# Altium footprint library SAMTEC SMD.PcbLib: 165 footprints (part 15 of 17) (continued)
## SAMTEC_SEAM-30-03.0-L-06-2-A-K-TR [mm] "PISMO 2, VITA 57, VITA 57 Standard, 6 rows x 30 Columns, 180 contacts Male Connector" (continued)
  text "180" at -19.74,-4.969 h1
  text "1" at 18.919,3.935 h1
Mechanical 15:
  lines w0.05: -21.79,-5.05 21.79,-5.05 21.79,-1.012 22.678,-1.012 22.678,1.012 21.79,1.012 21.79,5.05 -21.79,5.05 -21.79,-5.05
3D body "SEAM-30-03.0-L-06-2-A-K-TR.stp": height 6.6, standoff -1.27, extent -21.539,-4.8 22.428,4.801

## SAMTEC_SEAM-40-03.0-S-06-2-A-K-TR [mm] "240 contacts (6 rows x 40 Columns) High Speed/High Density Open Field Board Stacking Male Connector"
height 6.61
pads (242):
  round 0.64 smd paste+0.125: 1(24.761,3.175) 2(24.761,1.905) 3(24.761,0.635) 4(24.761,-0.635) 5(24.761,-1.905) 6(24.761,-3.175) 7(23.491,3.175) 8(23.491,1.905) 9(23.491,0.635) 10(23.491,-0.635) 11(23.491,-1.905) 12(23.491,-3.175) 13(22.221,3.175) 14(22.221,1.905) 15(22.221,0.635) 16(22.221,-0.635) 17(22.221,-1.905) 18(22.221,-3.175) 19(20.951,3.175) 20(20.951,1.905) 21(20.951,0.635) 22(20.951,-0.635) 23(20.951,-1.905) 24(20.951,-3.175) 25(19.681,3.175) 26(19.681,1.905) 27(19.681,0.635) 28(19.681,-0.635) 29(19.681,-1.905) 30(19.681,-3.175) 31(18.411,3.175) 32(18.411,1.905) 33(18.411,0.635) 34(18.411,-0.635) 35(18.411,-1.905) 36(18.411,-3.175) 37(17.141,3.175) 38(17.141,1.905) 39(17.141,0.635) 40(17.141,-0.635) 41(17.141,-1.905) 42(17.141,-3.175) 43(15.871,3.175) 44(15.871,1.905) 45(15.871,0.635) 46(15.871,-0.635) 47(15.871,-1.905) 48(15.871,-3.175) 49(14.601,3.175) 50(14.601,1.905) 51(14.601,0.635) 52(14.601,-0.635) 53(14.601,-1.905) 54(14.601,-3.175) 55(13.331,3.175) 56(13.331,1.905) 57(13.331,0.635) 58(13.331,-0.635) 59(13.331,-1.905) 60(13.331,-3.175) 61(12.061,3.175) 62(12.061,1.905) 63(12.061,0.635) 64(12.061,-0.635) 65(12.061,-1.905) 66(12.061,-3.175) 67(10.791,3.175) 68(10.791,1.905) 69(10.791,0.635) 70(10.791,-0.635) 71(10.791,-1.905) 72(10.791,-3.175) 73(9.521,3.175) 74(9.521,1.905) 75(9.521,0.635) 76(9.521,-0.635) 77(9.521,-1.905) 78(9.521,-3.175) 79(8.251,3.175) 80(8.251,1.905) 81(8.251,0.635) 82(8.251,-0.635) 83(8.251,-1.905) 84(8.251,-3.175) 85(6.981,3.175) 86(6.981,1.905) 87(6.981,0.635) 88(6.981,-0.635) 89(6.981,-1.905) 90(6.981,-3.175) 91(5.711,3.175) 92(5.711,1.905) 93(5.711,0.635) 94(5.711,-0.635) 95(5.711,-1.905) 96(5.711,-3.175) 97(4.441,3.175) 98(4.441,1.905) 99(4.441,0.635) 100(4.441,-0.635) 101(4.441,-1.905) 102(4.441,-3.175) 103(3.171,3.175) 104(3.171,1.905) 105(3.171,0.635) 106(3.171,-0.635) 107(3.171,-1.905) 108(3.171,-3.175) 109(1.901,3.175) 110(1.901,1.905) 111(1.901,0.635) 112(1.901,-0.635) 113(1.901,-1.905) 114(1.901,-3.175) 115(0.631,3.175) 116(0.631,1.905) 117(0.631,0.635) 118(0.631,-0.635) 119(0.631,-1.905) 120(0.631,-3.175) 121(-0.639,3.175) 122(-0.639,1.905) 123(-0.639,0.635) 124(-0.639,-0.635) 125(-0.639,-1.905) 126(-0.639,-3.175) 127(-1.909,3.175) 128(-1.909,1.905) 129(-1.909,0.635) 130(-1.909,-0.635) 131(-1.909,-1.905) 132(-1.909,-3.175) 133(-3.179,3.175) 134(-3.179,1.905) 135(-3.179,0.635) 136(-3.179,-0.635) 137(-3.179,-1.905) 138(-3.179,-3.175) 139(-4.449,3.175) 140(-4.449,1.905) 141(-4.449,0.635) 142(-4.449,-0.635) 143(-4.449,-1.905) 144(-4.449,-3.175) 145(-5.719,3.175) 146(-5.719,1.905) 147(-5.719,0.635) 148(-5.719,-0.635) 149(-5.719,-1.905) 150(-5.719,-3.175) 151(-6.989,3.175) 152(-6.989,1.905) 153(-6.989,0.635) 154(-6.989,-0.635) 155(-6.989,-1.905) 156(-6.989,-3.175) 157(-8.259,3.175) 158(-8.259,1.905) 159(-8.259,0.635) 160(-8.259,-0.635) 161(-8.259,-1.905) 162(-8.259,-3.175) 163(-9.529,3.175) 164(-9.529,1.905) 165(-9.529,0.635) 166(-9.529,-0.635) 167(-9.529,-1.905) 168(-9.529,-3.175) 169(-10.799,3.175) 170(-10.799,1.905) 171(-10.799,0.635) 172(-10.799,-0.635) 173(-10.799,-1.905) 174(-10.799,-3.175) 175(-12.069,3.175) 176(-12.069,1.905) 177(-12.069,0.635) 178(-12.069,-0.635) 179(-12.069,-1.905) 180(-12.069,-3.175) 181(-13.339,3.175) 182(-13.339,1.905) 183(-13.339,0.635) 184(-13.339,-0.635) 185(-13.339,-1.905) 186(-13.339,-3.175) 187(-14.609,3.175) 188(-14.609,1.905) 189(-14.609,0.635) 190(-14.609,-0.635) 191(-14.609,-1.905) 192(-14.609,-3.175) 193(-15.879,3.175) 194(-15.879,1.905) 195(-15.879,0.635) 196(-15.879,-0.635) 197(-15.879,-1.905) 198(-15.879,-3.175) 199(-17.149,3.175) 200(-17.149,1.905) 201(-17.149,0.635) 202(-17.149,-0.635) 203(-17.149,-1.905) 204(-17.149,-3.175) 205(-18.419,3.175) 206(-18.419,1.905) 207(-18.419,0.635) 208(-18.419,-0.635) 209(-18.419,-1.905) 210(-18.419,-3.175) 211(-19.689,3.175) 212(-19.689,1.905) 213(-19.689,0.635) 214(-19.689,-0.635) 215(-19.689,-1.905) 216(-19.689,-3.175) 217(-20.959,3.175) 218(-20.959,1.905) 219(-20.959,0.635) 220(-20.959,-0.635) 221(-20.959,-1.905) 222(-20.959,-3.175) 223(-22.229,3.175) 224(-22.229,1.905) 225(-22.229,0.635) 226(-22.229,-0.635) 227(-22.229,-1.905) 228(-22.229,-3.175) 229(-23.499,3.175) 230(-23.499,1.905) 231(-23.499,0.635) 232(-23.499,-0.635) 233(-23.499,-1.905) 234(-23.499,-3.175) 235(-24.769,3.175) 236(-24.769,1.905) 237(-24.769,0.635) 238(-24.769,-0.635) 239(-24.769,-1.905) 240(-24.769,-3.175)
  round 0.5 hole 1.3 unplated mask+0.4: MEC1(-27.195,-3.05) MEC2(27.185,0)
Top Overlay:
  lines w0.2: -27.893,-3.745 -27.893,-4.039 -27.131,-4.801 -26.805,-4.801 ; -27.893,-2.355 -27.893,4.039 -27.131,4.801 27.123,4.801 27.885,4.039 27.885,0.693 ; -26.953,-0.508 -26.953,0.508 ; -26.953,2.032 -26.953,3.2 ; -26.736,-2.032 -26.953,-1.397 ; -26.736,-0.508 -26.953,-1.143 ; -26.736,0.508 -26.953,1.143 ; -26.736,2.032 -26.953,1.397 ; -26.699,-2.199 -26.699,2.946 ; -26.699,-2.032 -27.893,-2.032 -27.258,-1.397 ; -26.699,-0.508 -27.893,-0.508 -27.258,-1.143 ; -26.699,0.508 -27.893,0.508 -27.258,1.143 ; -26.699,2.032 -27.893,2.032 -27.258,1.397 ; -26.222,-3.2 -25.419,-3.2 ; -26.215,-2.946 -25.419,-2.946 ; -25.419,-2.007 -26.42,-2.007 ; -25.419,-1.88 -26.293,-1.88 ; -25.419,-0.66 -26.293,-0.66 ; -25.419,-0.533 -26.42,-0.533 ; -25.419,0.533 -26.42,0.533 ; -25.419,0.66 -26.293,0.66 ; -25.419,1.88 -26.293,1.88 ; -25.419,2.007 -26.42,2.007 ; -25.419,2.946 -26.699,2.946 ; -25.419,3.2 -26.953,3.2 ; -22.931,-4.8 27.123,-4.8 27.885,-4.039 27.885,-0.693 ; 25.411,-3.2 25.929,-3.2 25.929,-2.946 ; 25.411,-2.946 25.929,-2.946 ; 25.411,-2.007 25.777,-2.007 ; 25.411,-1.88 25.65,-1.88 ; 25.411,-0.66 25.65,-0.66 ; 25.411,-0.533 25.777,-0.533 ; 25.411,0.533 25.777,0.533 ; 25.411,0.66 25.65,0.66 ; 25.411,1.88 25.65,1.88 ; 25.411,2.007 25.777,2.007 ; 25.411,2.946 26.691,2.946 ; 25.411,3.2 26.945,3.2 ; 25.472,3.2 25.421,3.073 26.437,3.073 26.387,3.2 ; 25.929,3.073 25.929,3.2 ; 26.691,-2.438 26.691,-0.852 ; 26.691,-2.007 27.885,-2.007 27.25,-1.383 ; 26.691,0.852 26.691,2.946 ; 26.691,2.007 27.885,2.007 27.25,1.371 ; 26.728,-2.007 26.945,-1.383 ; 26.728,2.007 26.945,1.371 ; 26.945,-2.007 26.945,-2.438 26.437,-2.438 ccw(c26.437,-2.946) 25.929,-2.946 ; 26.945,-0.956 26.945,-1.383 ; 26.945,0.955 26.945,1.371 ; 26.945,2.007 26.945,3.2 ; 27.25,-0.983 27.25,-1.383 ; 27.25,0.983 27.25,1.371 ; 27.879,-0.699 27.885,-0.699 ; 27.879,0.698 27.885,0.698 ; 27.885,-0.762 28.774,-0.762 28.774,0.762 27.885,0.762 ; -27.258,-1.397 -26.953,-1.397 ; -27.258,-1.397 -27.258,-1.143 ; -27.258,-1.143 -26.953,-1.143 ; -27.258,1.143 -26.953,1.143 ; -27.258,1.143 -27.258,1.397 ; -27.258,1.397 -26.953,1.397 ; -26.953,-1.397 -26.953,-1.143 ; -26.953,1.143 -26.953,1.397 ; -26.953,3.2 -26.699,2.946 ; -26.42,-2.007 -26.293,-1.88 ; -26.42,-2.007 -26.42,-0.533 ; -26.42,-0.533 -26.293,-0.66 ; -26.42,0.533 -26.293,0.66 ; -26.42,0.533 -26.42,2.007 ; -26.42,2.007 -26.293,1.88 ; -26.293,-1.88 -26.293,-0.66 ; -26.293,0.66 -26.293,1.88 ; 25.65,-1.88 25.777,-2.007 ; 25.65,-1.88 25.65,-0.66 ; 25.65,-0.66 25.777,-0.533 ; 25.65,0.66 25.65,1.88 ; 25.65,0.66 25.777,0.533 ; 25.65,1.88 25.777,2.007 ; 25.777,-2.007 25.777,-0.533 ; 25.777,0.533 25.777,2.007 ; 26.691,2.946 26.945,3.2 ; 26.945,-1.383 27.25,-1.383 ; 26.945,1.371 27.25,1.371
  text "240" at -26.094,-4.969 h1
  text "1" at 25.265,3.935 h1
Mechanical 8:
  drawing of 979 lines, arcs and shapes, not listed
Mechanical 14:
  lines w0.1: -26.953,-2.032 -26.953,-3.2 ; -26.953,-0.508 -26.953,0.508 ; -26.953,2.032 -26.953,3.2 ; -26.805,-4.801 -27.131,-4.801 -27.893,-4.039 -27.893,4.039 -27.131,4.801 27.123,4.801 27.885,4.039 27.885,-4.039 27.123,-4.801 -22.931,-4.8 ; -26.736,-2.032 -26.953,-1.397 ; -26.736,-0.508 -26.953,-1.143 ; -26.736,0.508 -26.953,1.143 ; -26.736,2.032 -26.953,1.397 ; -26.699,-2.032 -27.893,-2.032 -27.258,-1.397 ; -26.699,-0.508 -27.893,-0.508 -27.258,-1.143 ; -26.699,0.508 -27.893,0.508 -27.258,1.143 ; -26.699,2.032 -27.893,2.032 -27.258,1.397 ; -25.048,-3.2 -25.048,-3.251 -24.489,-3.251 -24.489,-3.2 ; -25.048,-1.88 -25.048,-1.829 -24.489,-1.829 -24.489,-1.88 ; -25.048,-0.66 -25.048,-0.711 -24.489,-0.711 -24.489,-0.66 ; -25.048,0.66 -25.048,0.711 -24.489,0.711 -24.489,0.66 ; -25.048,1.88 -25.048,1.829 -24.489,1.829 -24.489,1.88 ; -25.048,3.2 -25.048,3.251 -24.489,3.251 -24.489,3.2 ; 24.482,-3.2 24.482,-3.251 25.041,-3.251 25.041,-3.2 ; 24.482,-1.88 24.482,-1.829 25.041,-1.829 25.041,-1.88 ; 24.482,-0.66 24.482,-0.711 25.041,-0.711 25.041,-0.66 ; 24.482,0.66 24.482,0.711 25.041,0.711 25.041,0.66 ; 24.482,1.88 24.482,1.829 25.041,1.829 25.041,1.88 ; 24.482,3.2 24.482,3.251 25.041,3.251 25.041,3.2 ; 25.472,3.2 25.421,3.073 26.437,3.073 26.387,3.2 ; 25.929,3.073 25.929,3.2 ; 26.691,-2.438 26.691,-0.699 27.885,-0.699 ; 26.691,-2.007 27.885,-2.007 27.25,-1.383 ; 26.691,2.007 27.885,2.007 27.25,1.371 ; 26.728,-2.007 26.945,-1.383 ; 26.728,2.007 26.945,1.371 ; 26.945,-2.007 26.945,-2.438 26.437,-2.438 ccw(c26.437,-2.946) 25.929,-2.946 ; 26.945,-0.699 26.945,-1.383 ; 26.945,0.698 26.945,1.371 ; 26.945,2.007 26.945,3.2 ; 27.25,-0.699 27.25,-1.383 ; 27.25,0.698 27.25,1.371 ; 27.885,-0.762 28.774,-0.762 28.774,0.762 27.885,0.762 ; 27.885,0.698 26.691,0.698 26.691,2.946 ; -27.258,-1.397 -26.953,-1.397 ; -27.258,-1.397 -27.258,-1.143 ; -27.258,-1.143 -26.953,-1.143 ; -27.258,1.143 -26.953,1.143 ; -27.258,1.143 -27.258,1.397 ; -27.258,1.397 -26.953,1.397 ; -26.953,-3.2 -26.699,-2.946 ; -26.953,-3.2 25.929,-3.2 25.929,-2.946 ; -26.953,-1.397 -26.953,-1.143 ; -26.953,1.143 -26.953,1.397 ; -26.953,3.2 -26.699,2.946 ; -26.953,3.2 26.945,3.2 ; -26.699,-2.946 25.929,-2.946 ; -26.699,-2.946 -26.699,2.946 ; -26.699,2.946 26.691,2.946 ; -26.42,-2.007 -26.293,-1.88 ; -26.42,-2.007 -26.42,-0.533 ; -26.42,-2.007 25.777,-2.007 ; -26.42,-0.533 -26.293,-0.66 ; -26.42,-0.533 25.777,-0.533 ; -26.42,0.533 -26.293,0.66 ; -26.42,0.533 -26.42,2.007 ; -26.42,0.533 25.777,0.533 ; -26.42,2.007 -26.293,1.88 ; -26.42,2.007 25.777,2.007 ; -26.293,-1.88 -26.293,-0.66 ; -26.293,-1.88 25.65,-1.88 ; -26.293,-0.66 25.65,-0.66 ; -26.293,0.66 -26.293,1.88 ; -26.293,0.66 25.65,0.66 ; -26.293,1.88 25.65,1.88 ; 25.65,-1.88 25.777,-2.007 ; 25.65,-1.88 25.65,-0.66 ; 25.65,-0.66 25.777,-0.533 ; 25.65,0.66 25.65,1.88 ; 25.65,0.66 25.777,0.533 ; 25.65,1.88 25.777,2.007 ; 25.777,-2.007 25.777,-0.533 ; 25.777,0.533 25.777,2.007 ; 26.691,2.946 26.945,3.2 ; 26.945,-1.383 27.25,-1.383 ; 26.945,1.371 27.25,1.371
  text "240" at -26.094,-4.969 h1
  text "1" at 25.265,3.935 h1
Mechanical 15:
  lines w0.05: -28.144,-5.05 28.136,-5.05 28.136,-1.012 29.024,-1.012 29.024,1.012 28.136,1.012 28.136,5.05 -28.144,5.05 -28.144,-5.05
3D body "SAMTEC_SEAM-40-03.0-S-06-2-A-K-TR.stp": height 6.6, standoff -1.27, extent -27.89,-4.8 28.778,4.801

## SAMTEC_SEAM-40-03.5-S-08-2-A-K [mm] "320 contacts (8 rows x 40 Columns) High Speed/High Density Open Field Board Stacking Male Connector"
height 7.12
pads (322):
  round 0.64 smd paste+0.125: 1(24.766,4.445) 2(24.766,3.175) 3(24.766,1.905) 4(24.766,0.635) 5(24.766,-0.635) 6(24.766,-1.905) 7(24.766,-3.175) 8(24.766,-4.445) 9(23.496,4.445) 10(23.496,3.175) 11(23.496,1.905) 12(23.496,0.635) 13(23.496,-0.635) 14(23.496,-1.905) 15(23.496,-3.175) 16(23.496,-4.445) 17(22.226,4.445) 18(22.226,3.175) 19(22.226,1.905) 20(22.226,0.635) 21(22.226,-0.635) 22(22.226,-1.905) 23(22.226,-3.175) 24(22.226,-4.445) 25(20.956,4.445) 26(20.956,3.175) 27(20.956,1.905) 28(20.956,0.635) 29(20.956,-0.635) 30(20.956,-1.905) 31(20.956,-3.175) 32(20.956,-4.445) 33(19.686,4.445) 34(19.686,3.175) 35(19.686,1.905) 36(19.686,0.635) 37(19.686,-0.635) 38(19.686,-1.905) 39(19.686,-3.175) 40(19.686,-4.445) 41(18.416,4.445) 42(18.416,3.175) 43(18.416,1.905) 44(18.416,0.635) 45(18.416,-0.635) 46(18.416,-1.905) 47(18.416,-3.175) 48(18.416,-4.445) 49(17.146,4.445) 50(17.146,3.175) 51(17.146,1.905) 52(17.146,0.635) 53(17.146,-0.635) 54(17.146,-1.905) 55(17.146,-3.175) 56(17.146,-4.445) 57(15.876,4.445) 58(15.876,3.175) 59(15.876,1.905) 60(15.876,0.635) 61(15.876,-0.635) 62(15.876,-1.905) 63(15.876,-3.175) 64(15.876,-4.445) 65(14.606,4.445) 66(14.606,3.175) 67(14.606,1.905) 68(14.606,0.635) 69(14.606,-0.635) 70(14.606,-1.905) 71(14.606,-3.175) 72(14.606,-4.445) 73(13.336,4.445) 74(13.336,3.175) 75(13.336,1.905) 76(13.336,0.635) 77(13.336,-0.635) 78(13.336,-1.905) 79(13.336,-3.175) 80(13.336,-4.445) 81(12.066,4.445) 82(12.066,3.175) 83(12.066,1.905) 84(12.066,0.635) 85(12.066,-0.635) 86(12.066,-1.905) 87(12.066,-3.175) 88(12.066,-4.445) 89(10.796,4.445) 90(10.796,3.175) 91(10.796,1.905) 92(10.796,0.635) 93(10.796,-0.635) 94(10.796,-1.905) 95(10.796,-3.175) 96(10.796,-4.445) 97(9.526,4.445) 98(9.526,3.175) 99(9.526,1.905) 100(9.526,0.635) 101(9.526,-0.635) 102(9.526,-1.905) 103(9.526,-3.175) 104(9.526,-4.445) 105(8.256,4.445) 106(8.256,3.175) 107(8.256,1.905) 108(8.256,0.635) 109(8.256,-0.635) 110(8.256,-1.905) 111(8.256,-3.175) 112(8.256,-4.445) 113(6.986,4.445) 114(6.986,3.175) 115(6.986,1.905) 116(6.986,0.635) 117(6.986,-0.635) 118(6.986,-1.905) 119(6.986,-3.175) 120(6.986,-4.445) 121(5.716,4.445) 122(5.716,3.175) 123(5.716,1.905) 124(5.716,0.635) 125(5.716,-0.635) 126(5.716,-1.905) 127(5.716,-3.175) 128(5.716,-4.445) 129(4.446,4.445) 130(4.446,3.175) 131(4.446,1.905) 132(4.446,0.635) 133(4.446,-0.635) 134(4.446,-1.905) 135(4.446,-3.175) 136(4.446,-4.445) 137(3.176,4.445) 138(3.176,3.175) 139(3.176,1.905) 140(3.176,0.635) 141(3.176,-0.635) 142(3.176,-1.905) 143(3.176,-3.175) 144(3.176,-4.445) 145(1.906,4.445) 146(1.906,3.175) 147(1.906,1.905) 148(1.906,0.635) 149(1.906,-0.635) 150(1.906,-1.905) 151(1.906,-3.175) 152(1.906,-4.445) 153(0.636,4.445) 154(0.636,3.175) 155(0.636,1.905) 156(0.636,0.635) 157(0.636,-0.635) 158(0.636,-1.905) 159(0.636,-3.175) 160(0.636,-4.445) 161(-0.634,4.445) 162(-0.634,3.175) 163(-0.634,1.905) 164(-0.634,0.635) 165(-0.634,-0.635) 166(-0.634,-1.905) 167(-0.634,-3.175) 168(-0.634,-4.445) 169(-1.904,4.445) 170(-1.904,3.175) 171(-1.904,1.905) 172(-1.904,0.635) 173(-1.904,-0.635) 174(-1.904,-1.905) 175(-1.904,-3.175) 176(-1.904,-4.445) 177(-3.174,4.445) 178(-3.174,3.175) 179(-3.174,1.905) 180(-3.174,0.635) 181(-3.174,-0.635) 182(-3.174,-1.905) 183(-3.174,-3.175) 184(-3.174,-4.445) 185(-4.444,4.445) 186(-4.444,3.175) 187(-4.444,1.905) 188(-4.444,0.635) 189(-4.444,-0.635) 190(-4.444,-1.905) 191(-4.444,-3.175) 192(-4.444,-4.445) 193(-5.714,4.445) 194(-5.714,3.175) 195(-5.714,1.905) 196(-5.714,0.635) 197(-5.714,-0.635) 198(-5.714,-1.905) 199(-5.714,-3.175) 200(-5.714,-4.445) 201(-6.984,4.445) 202(-6.984,3.175) 203(-6.984,1.905) 204(-6.984,0.635) 205(-6.984,-0.635) 206(-6.984,-1.905) 207(-6.984,-3.175) 208(-6.984,-4.445) 209(-8.254,4.445) 210(-8.254,3.175) 211(-8.254,1.905) 212(-8.254,0.635) 213(-8.254,-0.635) 214(-8.254,-1.905) 215(-8.254,-3.175) 216(-8.254,-4.445) 217(-9.524,4.445) 218(-9.524,3.175) 219(-9.524,1.905) 220(-9.524,0.635) 221(-9.524,-0.635) 222(-9.524,-1.905) 223(-9.524,-3.175) 224(-9.524,-4.445) 225(-10.794,4.445) 226(-10.794,3.175) 227(-10.794,1.905) 228(-10.794,0.635) 229(-10.794,-0.635) 230(-10.794,-1.905) 231(-10.794,-3.175) 232(-10.794,-4.445) 233(-12.064,4.445) 234(-12.064,3.175) 235(-12.064,1.905) 236(-12.064,0.635) 237(-12.064,-0.635) 238(-12.064,-1.905) 239(-12.064,-3.175) 240(-12.064,-4.445) 241(-13.334,4.445) 242(-13.334,3.175) 243(-13.334,1.905) 244(-13.334,0.635) 245(-13.334,-0.635) 246(-13.334,-1.905) 247(-13.334,-3.175) 248(-13.334,-4.445) 249(-14.604,4.445) 250(-14.604,3.175) 251(-14.604,1.905) 252(-14.604,0.635) 253(-14.604,-0.635) 254(-14.604,-1.905) 255(-14.604,-3.175) 256(-14.604,-4.445) 257(-15.874,4.445) 258(-15.874,3.175) 259(-15.874,1.905) 260(-15.874,0.635) 261(-15.874,-0.635) 262(-15.874,-1.905) 263(-15.874,-3.175) 264(-15.874,-4.445) 265(-17.144,4.445) 266(-17.144,3.175) 267(-17.144,1.905) 268(-17.144,0.635) 269(-17.144,-0.635) 270(-17.144,-1.905) 271(-17.144,-3.175) 272(-17.144,-4.445) 273(-18.414,4.445) 274(-18.414,3.175) 275(-18.414,1.905) 276(-18.414,0.635) 277(-18.414,-0.635) 278(-18.414,-1.905) 279(-18.414,-3.175) 280(-18.414,-4.445) 281(-19.684,4.445) 282(-19.684,3.175) 283(-19.684,1.905) 284(-19.684,0.635) 285(-19.684,-0.635) 286(-19.684,-1.905) 287(-19.684,-3.175) 288(-19.684,-4.445) 289(-20.954,4.445) 290(-20.954,3.175) 291(-20.954,1.905) 292(-20.954,0.635) 293(-20.954,-0.635) 294(-20.954,-1.905) 295(-20.954,-3.175) 296(-20.954,-4.445) 297(-22.224,4.445) 298(-22.224,3.175) 299(-22.224,1.905) 300(-22.224,0.635) 301(-22.224,-0.635) 302(-22.224,-1.905) 303(-22.224,-3.175) 304(-22.224,-4.445) 305(-23.494,4.445) 306(-23.494,3.175) 307(-23.494,1.905) 308(-23.494,0.635) 309(-23.494,-0.635) 310(-23.494,-1.905) 311(-23.494,-3.175) 312(-23.494,-4.445) 313(-24.764,4.445) 314(-24.764,3.175) 315(-24.764,1.905) 316(-24.764,0.635) 317(-24.764,-0.635) 318(-24.764,-1.905) 319(-24.764,-3.175) 320(-24.764,-4.445)
  round 0.5 hole 1.3 unplated mask+0.4: MEC1(-27.19,-3.05) MEC2(27.19,0)
Top Overlay:
  lines w0.2: -27.889,-3.651 -27.889,-5.309 -27.127,-6.071 27.127,-6.071 27.889,-5.309 27.889,-0.762 ; -27.889,-2.54 -27.889,5.309 -27.127,6.071 27.127,6.071 27.889,5.309 27.889,0.762 ; -27.445,-2.222 -27.889,-1.778 -26.695,-1.778 ; -26.949,-3.81 -26.949,-4.47 ; -26.949,-1.778 -26.949,1.778 ; -26.949,3.302 -26.949,4.47 ; -26.878,-2.206 -26.732,-1.778 ; -26.732,1.778 -26.949,2.413 ; -26.732,3.302 -26.949,2.667 ; -26.695,-3.651 -26.695,-4.216 ; -26.695,-2.381 -26.695,4.216 ; -26.695,1.778 -27.889,1.778 -27.254,2.413 ; -26.695,3.302 -27.889,3.302 -27.254,2.667 ; -25.4,-4.47 -26.949,-4.47 ; -25.4,-4.216 -26.695,-4.216 ; -25.4,-3.277 -26.416,-3.277 ; -25.4,-3.15 -26.289,-3.15 ; -25.4,-1.93 -26.289,-1.93 ; -25.4,-1.803 -26.416,-1.803 ; -25.4,-0.737 -25.781,-0.737 ; -25.4,-0.61 -25.654,-0.61 ; -25.4,0.61 -25.654,0.61 ; -25.4,0.737 -25.781,0.737 ; -25.4,1.803 -26.416,1.803 ; -25.4,1.93 -26.289,1.93 ; -25.4,3.15 -26.289,3.15 ; -25.4,3.277 -26.416,3.277 ; -25.4,4.216 -26.695,4.216 ; -25.4,4.47 -26.949,4.47 ; 25.4,-4.47 26.949,-4.47 ; 25.4,-4.216 26.695,-4.216 ; 25.4,-3.277 25.781,-3.277 ; 25.4,-3.15 25.654,-3.15 ; 25.4,-1.93 25.654,-1.93 ; 25.4,-1.803 25.781,-1.803 ; 25.4,-0.737 26.416,-0.737 ; 25.4,-0.61 26.289,-0.61 ; 25.4,0.61 26.289,0.61 ; 25.4,0.737 26.416,0.737 ; 25.4,1.803 25.781,1.803 ; 25.4,1.93 25.654,1.93 ; 25.4,3.15 25.654,3.15 ; 25.4,3.277 25.781,3.277 ; 25.4,4.216 26.695,4.216 ; 25.4,4.47 26.949,4.47 ; 25.476,4.47 25.425,4.343 26.441,4.343 26.391,4.47 ; 26.949,-0.762 26.949,-4.47 ; 26.949,0.762 26.949,4.47 ; -27.254,2.413 -27.254,2.667 ; -27.254,2.413 -26.949,2.413 ; -27.254,2.667 -26.949,2.667 ; -26.949,-4.47 -26.695,-4.216 ; -26.949,2.413 -26.949,2.667 ; -26.949,4.47 -26.695,4.216 ; -26.416,-3.277 -26.289,-3.15 ; -26.416,-3.277 -26.416,-1.803 ; -26.416,-1.803 -26.289,-1.93 ; -26.416,1.803 -26.289,1.93 ; -26.416,1.803 -26.416,3.277 ; -26.416,3.277 -26.289,3.15 ; -26.289,-3.15 -26.289,-1.93 ; -26.289,1.93 -26.289,3.15 ; -25.781,-0.737 -25.654,-0.61 ; -25.781,-0.737 -25.781,0.737 ; -25.781,0.737 -25.654,0.61 ; -25.654,-0.61 -25.654,0.61 ; 25.654,-3.15 25.781,-3.277 ; 25.654,-3.15 25.654,-1.93 ; 25.654,-1.93 25.781,-1.803 ; 25.654,1.93 25.781,1.803 ; 25.654,1.93 25.654,3.15 ; 25.654,3.15 25.781,3.277 ; 25.781,-3.277 25.781,-1.803 ; 25.781,1.803 25.781,3.277 ; 26.289,-0.61 26.416,-0.737 ; 26.289,-0.61 26.289,0.61 ; 26.289,0.61 26.416,0.737 ; 26.416,-0.737 26.416,0.737 ; 26.695,-4.216 26.949,-4.47 ; 26.695,-4.216 26.695,-0.762 28.778,-0.762 28.778,0.762 26.695,0.762 26.695,4.216 ; 26.695,4.216 26.949,4.47
  text "1" at 25.27,5.205 h1
  text "320" at -26.249,-7.615 h1
Mechanical 8:
  drawing of 1294 lines, arcs and shapes, not listed
Mechanical 14:
  lines w0.1: -26.949,-3.302 -26.949,-4.47 ; -26.949,-1.778 -26.949,1.778 ; -26.949,3.302 -26.949,4.47 ; -26.732,-3.302 -26.949,-2.667 ; -26.732,-1.778 -26.949,-2.413 ; -26.732,1.778 -26.949,2.413 ; -26.732,3.302 -26.949,2.667 ; -26.695,-3.302 -27.889,-3.302 -27.254,-2.667 ; -26.695,-1.778 -27.889,-1.778 -27.254,-2.413 ; -26.695,1.778 -27.889,1.778 -27.254,2.413 ; -26.695,3.302 -27.889,3.302 -27.254,2.667 ; -25.26,-3.277 -26.416,-3.277 ; -25.26,-1.803 -26.416,-1.803 ; -25.26,-0.737 -25.781,-0.737 ; -25.26,0.737 -25.781,0.737 ; -25.26,1.803 -26.416,1.803 ; -25.26,3.277 -26.416,3.277 ; 25.26,-3.277 25.781,-3.277 ; 25.26,-1.803 25.781,-1.803 ; 25.26,-0.737 26.416,-0.737 ; 25.26,0.737 26.416,0.737 ; 25.26,1.803 25.781,1.803 ; 25.26,3.277 25.781,3.277 ; 25.476,4.47 25.425,4.343 26.441,4.343 26.391,4.47 ; 26.695,-0.762 28.778,-0.762 28.778,0.762 26.695,0.762 ; 26.732,-0.762 26.949,-0.138 ; 26.732,0.762 26.949,0.127 ; 26.949,-0.762 26.949,-4.47 ; 26.949,0.762 26.949,4.47 ; 27.889,-0.762 27.254,-0.138 ; 27.889,0.762 27.254,0.127 ; -27.254,-2.667 -27.254,-2.413 ; -27.254,-2.667 -26.949,-2.667 ; -27.254,-2.413 -26.949,-2.413 ; -27.254,2.413 -27.254,2.667 ; -27.254,2.413 -26.949,2.413 ; -27.254,2.667 -26.949,2.667 ; -26.949,-4.47 -25.26,-4.47 -25.26,-4.329 25.26,-4.329 25.26,-4.47 26.949,-4.47 ; -26.949,-4.47 -26.695,-4.216 ; -26.949,-2.667 -26.949,-2.413 ; -26.949,2.413 -26.949,2.667 ; -26.949,4.47 -26.695,4.216 ; -26.949,4.47 -25.26,4.47 -25.26,4.329 25.26,4.329 25.26,4.47 26.949,4.47 ; -26.695,-4.216 -24.981,-4.216 26.695,-4.216 ; -26.695,-4.216 -26.695,4.216 ; -26.695,4.216 -24.981,4.216 26.695,4.216 ; -26.416,-3.277 -26.289,-3.15 ; -26.416,-3.277 -26.416,-1.803 ; -26.416,-1.803 -26.289,-1.93 ; -26.416,1.803 -26.289,1.93 ; -26.416,1.803 -26.416,3.277 ; -26.416,3.277 -26.289,3.15 ; -26.289,-3.15 -26.289,-1.93 ; -26.289,-3.15 -25.26,-3.15 -25.26,-3.291 25.26,-3.291 25.26,-3.15 25.654,-3.15 ; -26.289,-1.93 -25.26,-1.93 -25.26,-1.789 25.26,-1.789 25.26,-1.93 25.654,-1.93 ; -26.289,1.93 -26.289,3.15 ; -26.289,1.93 -25.26,1.93 -25.26,1.789 25.26,1.789 25.26,1.93 25.654,1.93 ; -26.289,3.15 -25.26,3.15 -25.26,3.291 25.26,3.291 25.26,3.15 25.654,3.15 ; -25.781,-0.737 -25.654,-0.61 ; -25.781,-0.737 -25.781,0.737 ; -25.781,0.737 -25.654,0.61 ; -25.654,-0.61 -25.654,0.61 ; -25.654,-0.61 -25.26,-0.61 -25.26,-0.751 -22.009,-0.751 25.26,-0.751 25.26,-0.61 26.289,-0.61 ; -25.654,0.61 -25.26,0.61 -25.26,0.751 25.26,0.751 25.26,0.61 26.289,0.61 ; 25.654,-3.15 25.781,-3.277 ; 25.654,-3.15 25.654,-1.93 ; 25.654,-1.93 25.781,-1.803 ; 25.654,1.93 25.781,1.803 ; 25.654,1.93 25.654,3.15 ; 25.654,3.15 25.781,3.277 ; 25.781,-3.277 25.781,-1.803 ; 25.781,1.803 25.781,3.277 ; 26.289,-0.61 26.416,-0.737 ; 26.289,-0.61 26.289,0.61 ; 26.289,0.61 26.416,0.737 ; 26.416,-0.737 26.416,0.737 ; 26.695,-4.216 26.949,-4.47 ; 26.695,-4.216 26.695,4.216 ; 26.695,4.216 26.949,4.47 ; 26.949,-0.138 26.949,0.127 ; 26.949,-0.138 27.254,-0.138 ; 26.949,0.127 27.254,0.127 ; 27.254,-0.138 27.254,0.127 ; -27.889,-5.309 -27.127,-6.071 27.127,-6.071 27.889,-5.309 27.889,5.309 27.127,6.071 -27.127,6.071 -27.889,5.309 -27.889,-5.309
  text "1" at 25.27,5.205 h1
  text "320" at -26.249,-7.615 h1
Mechanical 15:
  lines w0.05: -28.139,-6.321 28.139,-6.321 28.139,-1.012 29.028,-1.012 29.028,1.012 28.139,1.012 28.139,6.321 -28.139,6.321 -28.139,-6.321
3D body "SAMTEC_SEAM-40-03.5-S-08-2-A-K.stp": height 7.11, standoff -1.27, extent -27.889,-6.07 28.778,6.071